# Altium footprint library General.PCBLIB: 130 footprints (part 4 of 9)
Each footprint in its own frame and in the unit in brackets; x right, y up, seen from the top. Pads: shape width x height; smd on the part's side, far side on the other; paste and mask are expansions set on the pad; w line width, h text height; cw(c..) or ccw(c..) is an arc to the next point about the centre after c.
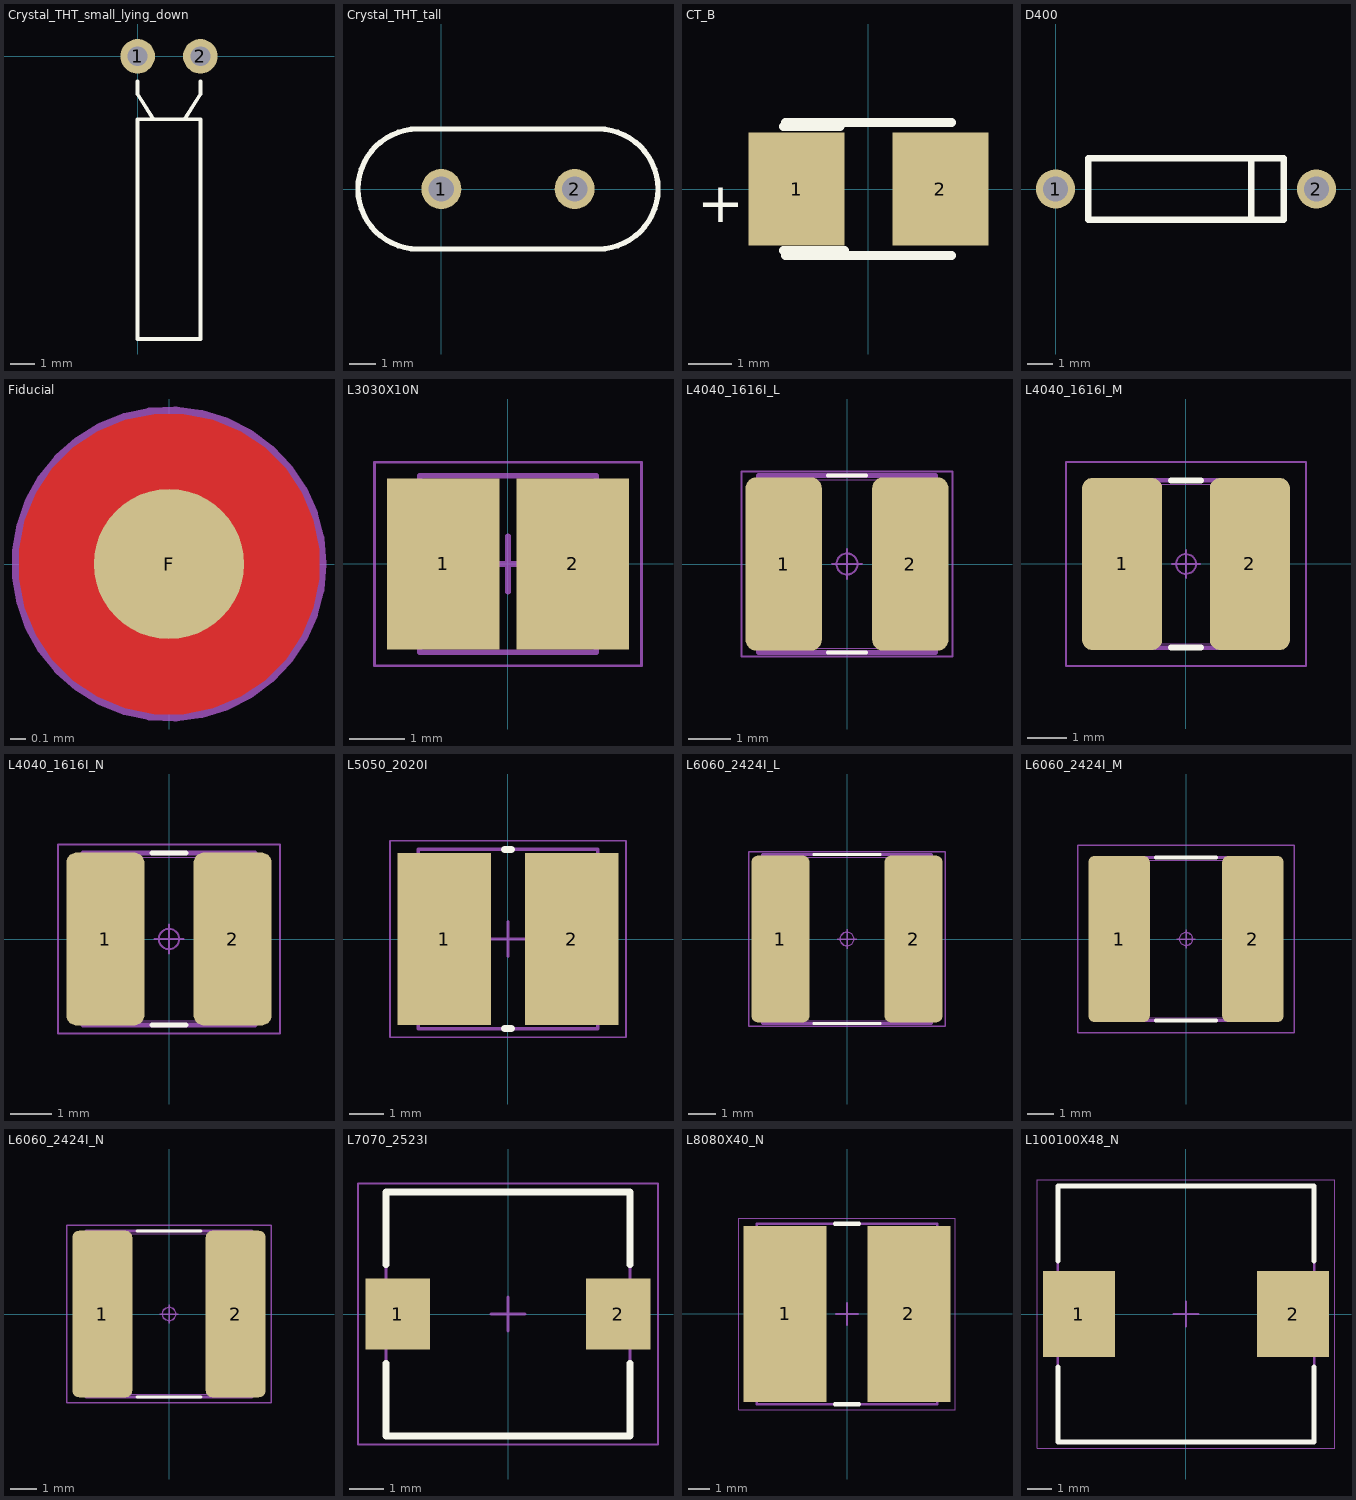
[diagram p3: the footprints below, top view; thin cyan lines are the x and y axes]

## Crystal_THT_small_lying_down [mm]
pads (2):
  round 1.4 hole 0.8: 1(0,0) 2(2.54,0)
Top Overlay:
  lines w0.15: 0,-1.016 0,-1.524 0.635,-2.54 ; 1.905,-2.54 2.54,-1.524 2.54,-1.016 ; 0,-11.43 0,-2.54 2.54,-2.54 2.54,-11.43 0,-11.43
Top DesignatorDoc:
  text ".Designator" at 1.27,-6.35 h1.2

## Crystal_THT_tall [mil] "Crystal tall THT"
height 551.18
pads (2):
  round 60 hole 38: 1(0,0) 2(200,0)
Top Overlay:
  lines w8: -35,-90 cw(c-35,0) -35,90 235,90 cw(c235,0) 235,-90 -35,-90
Top DesignatorDoc:
  text ".Designator" at 100,0 h47.24
3D body "User Library-Crystal_V2009.step": height 505.91, standoff -78.74, extent -112.6,-85 312.6,88.23

## CT_B [mm]
pads (2):
  rect 2.2x2.6 smd: 1(-1.651,0) 2(1.651,0)
Top Overlay:
  lines w0.203: -1.949,-1.414 -0.549,-1.414 ; -1.949,1.436 -0.649,1.436 ; -1.905,-1.524 1.905,-1.524 ; -1.905,1.524 1.905,1.524
  text "+" at -3.937,-0.762 h0.94
Top DesignatorDoc:
  text ".Designator" at 0,0 h1.2

## D400 [mil]
pads (2):
  round 60 hole 38: 1(0,0) 2(400,0)
Top Overlay:
  lines w10: 300,-47.24 300,47.24 ; 50,-47.24 350,-47.24 350,47.24 50,47.24 50,-47.24
Top DesignatorDoc:
  text ".Designator" at 200,0 h47.24

## Fiducial [mm]
pads (1):
  round 1 smd paste-2 mask+0.5: F(0,0)
Top Layer:
  region: 0,-1 -0.098,-1 -0.292,-0.962 -0.474,-0.886 -0.637,-0.777 -0.777,-0.637 -0.886,-0.474 -0.962,-0.292 -1,-0.098 -1,0 -1,0.098 -0.962,0.292 -0.886,0.474 -0.777,0.637 -0.637,0.777 -0.474,0.886 -0.292,0.962 -0.098,1 0,1 0.098,1 0.292,0.962 0.474,0.886 0.637,0.777 0.777,0.637 0.886,0.474 0.962,0.292 1,0.098 1,0 1,-0.098 0.962,-0.292 0.886,-0.474 0.777,-0.637 0.637,-0.777 0.474,-0.886 0.292,-0.962 0.098,-1
Top Body, 3D Models:
  circle w0.1: c0,0 r1
Top DesignatorDoc:
  text ".Designator" at 1.27,0 h1.2

## L3030X10N [mm] "Precision Wire Wound Inductor, 2-Leads, Body 3.00x3.00mm, IPC Medium Density"
height 1
pads (2):
  rect 2.05x3.1 smd: 1(-1.175,0) 2(1.175,0)
Top Body, 3D Models:
  lines w0.1: -1.6,-1.6 1.6,-1.6 1.6,1.6 -1.6,1.6 -1.6,-1.6
Top Courtyard:
  lines w0.05: -2.425,-1.85 2.425,-1.85 2.425,1.85 -2.425,1.85 -2.425,-1.85
  lines w0.1: -0.5,0 0.5,0 ; 0,-0.5 0,0.5
Top DesignatorDoc:
  text ".Designator" at 0,0 h1.2
3D body: height 1, standoff 0, extent -1.6,-1.6 1.6,1.6

## L4040_1616I_L [mm] "Inductor, Chip; 4.00 mm L X 4.00 mm W X 2.50 mm H body"
height 2.5
pads (2):
  rrect28% 1.81x4.12 smd: 1(-1.505,0) 2(1.505,0)
Top Overlay:
  lines w0.1: -0.45,-2.1 0.45,-2.1 ; -0.45,2.1 0.45,2.1
Top Dimensions:
  lines w0.12: -2.1,-2.1 -2.1,2.1 2.1,2.1 2.1,-2.1 -2.1,-2.1
Bottom Dimensions:
  lines w0.025: -2,-2 -0.75,-2 -0.75,2 -2,2 ; -2,-2 -2,2 ; -2,-2 -2,2 ; -2,-2 2,-2 ; -2,2 2,2 ; 2,-2 2,2 ; 2,-2 0.75,-2 0.75,2 2,2 ; 2,-2 2,2
Top Courtyard:
  circle w0.05: c0,0 r0.25
  lines w0.05: -0.35,0 0.35,0 ; 0,-0.35 0,0.35 ; -2.51,-2.2 -2.51,2.2 2.51,2.2 2.51,-2.2 -2.51,-2.2
Top DesignatorDoc:
  text ".Designator" at 0,0 h1
3D body "STEP-WE-LQS-4025-rev1.stp": height 2.15, standoff 0, extent -2,-2 2,2

## L4040_1616I_M [mm] "Inductor, Chip; 4.00 mm L X 4.00 mm W X 2.50 mm H body"
height 2.5
pads (2):
  rrect25% 2.01x4.32 smd: 1(-1.605,0) 2(1.605,0)
Top Overlay:
  lines w0.15: -0.375,-2.1 0.375,-2.1 ; -0.375,2.1 0.375,2.1
Top Dimensions:
  lines w0.12: -2.1,-2.1 2.1,-2.1 2.1,2.1 -2.1,2.1 -2.1,-2.1
Bottom Dimensions:
  lines w0.025: -2,-2 2,-2 ; -2,-2 -2,2 ; -2,-2 -2,2 ; -2,-2 -0.75,-2 -0.75,2 -2,2 ; -2,2 2,2 ; 2,-2 2,2 ; 2,-2 0.75,-2 0.75,2 2,2 ; 2,-2 2,2
Top Courtyard:
  circle w0.05: c0,0 r0.25
  lines w0.05: -0.35,0 0.35,0 ; 0,-0.35 0,0.35 ; -3.01,-2.56 3.01,-2.56 3.01,2.56 -3.01,2.56 -3.01,-2.56
Top DesignatorDoc:
  text ".Designator" at 0,0 h1.5
3D body "STEP-WE-LQS-4025-rev1.stp": height 2.15, standoff 0, extent -2,-2 2,2

## L4040_1616I_N [mm] "Inductor, Chip; 4.00 mm L X 4.00 mm W X 2.50 mm H body"
height 2.5
pads (2):
  rrect26% 1.91x4.22 smd: 1(-1.555,0) 2(1.555,0)
Top Overlay:
  lines w0.12: -0.42,-2.1 0.42,-2.1 ; -0.42,2.1 0.42,2.1
Top Dimensions:
  lines w0.12: -2.1,-2.1 -2.1,2.1 2.1,2.1 2.1,-2.1 -2.1,-2.1
Bottom Dimensions:
  lines w0.025: -2,-2 -0.75,-2 -0.75,2 -2,2 ; -2,-2 -2,2 ; -2,-2 -2,2 ; -2,-2 2,-2 ; -2,2 2,2 ; 2,-2 2,2 ; 2,-2 0.75,-2 0.75,2 2,2 ; 2,-2 2,2
Top Courtyard:
  circle w0.05: c0,0 r0.25
  lines w0.05: -0.35,0 0.35,0 ; 0,-0.35 0,0.35 ; -2.71,-2.31 -2.71,2.31 2.71,2.31 2.71,-2.31 -2.71,-2.31
Top DesignatorDoc:
  text ".Designator" at 0,0 h1.2
3D body "STEP-WE-LQS-4025-rev1.stp": height 2.15, standoff 0, extent -2,-2 2,2

## L5050_2020I [mm] "Precision Wire Wound Inductor, 2-Leads, Body 5,00x5,00mm, IPC Medium Density"
height 2.2
pads (2):
  rect 2.7x5 smd: 1(-1.85,0) 2(1.85,0)
Top Overlay:
  lines w0.2: -0.1,-2.6 0.1,-2.6 ; -0.1,2.6 0.1,2.6
Top Body, 3D Models:
  lines w0.1: -2.6,-2.6 2.6,-2.6 2.6,2.6 -2.6,2.6 -2.6,-2.6
Top Courtyard:
  lines w0.05: -3.425,-2.85 3.425,-2.85 3.425,2.85 -3.425,2.85 -3.425,-2.85
  lines w0.1: -0.5,0 0.5,0 ; 0,-0.5 0,0.5
Top DesignatorDoc:
  text ".Designator" at 0,0 h1.2
3D body: height 2.2, standoff 0, extent -2.6,-2.6 2.6,2.6

## L6060_2424I_L [mm] "Inductor, Chip; 6.00 mm L X 6.00 mm W X 2.80 mm H body"
height 2.8
pads (2):
  rrect23% 2.14x6.12 smd: 1(-2.44,0) 2(2.44,0)
Top Overlay:
  lines w0.1: -1.22,-3.1 1.22,-3.1 ; -1.22,3.1 1.22,3.1
Top Dimensions:
  lines w0.12: -3.1,-3.1 3.1,-3.1 3.1,3.1 -3.1,3.1 -3.1,-3.1
Bottom Dimensions:
  lines w0.025: -3,-3 3,-3 ; -3,-3 -3,3 ; -3,-3 -3,3 ; -3,-3 -1.5,-3 -1.5,3 -3,3 ; -3,3 3,3 ; 3,-3 3,3 ; 3,-3 1.5,-3 1.5,3 3,3 ; 3,-3 3,3
Top Courtyard:
  circle w0.05: c0,0 r0.25
  lines w0.05: -0.35,0 0.35,0 ; 0,-0.35 0,0.35 ; -3.61,-3.2 3.61,-3.2 3.61,3.2 -3.61,3.2 -3.61,-3.2
Top DesignatorDoc:
  text ".Designator" at 0,0 h1
3D body "STEP-WE-LQS-6045-rev1.stp": height 4.51, standoff 0.01, extent -3,-3 3,3

## L6060_2424I_M [mm] "Inductor, Chip; 6.00 mm L X 6.00 mm W X 2.80 mm H body"
height 2.8
pads (2):
  rrect21% 2.34x6.32 smd: 1(-2.54,0) 2(2.54,0)
Top Overlay:
  lines w0.15: -1.145,-3.1 1.145,-3.1 ; -1.145,3.1 1.145,3.1
Top Dimensions:
  lines w0.12: -3.1,-3.1 -3.1,3.1 3.1,3.1 3.1,-3.1 -3.1,-3.1
Bottom Dimensions:
  lines w0.025: -3,-3 -1.5,-3 -1.5,3 -3,3 ; -3,-3 -3,3 ; -3,-3 -3,3 ; -3,-3 3,-3 ; -3,3 3,3 ; 3,-3 3,3 ; 3,-3 1.5,-3 1.5,3 3,3 ; 3,-3 3,3
Top Courtyard:
  circle w0.05: c0,0 r0.25
  lines w0.05: -0.35,0 0.35,0 ; 0,-0.35 0,0.35 ; -4.11,-3.56 -4.11,3.56 4.11,3.56 4.11,-3.56 -4.11,-3.56
Top DesignatorDoc:
  text ".Designator" at 0,0 h1.5
3D body "STEP-WE-LQS-6045-rev1.stp": height 4.51, standoff 0.01, extent -3,-3 3,3

## L6060_2424I_N [mm] "Inductor, Chip; 6.00 mm L X 6.00 mm W X 2.80 mm H body"
height 2.8
pads (2):
  rrect22% 2.24x6.22 smd: 1(-2.49,0) 2(2.49,0)
Top Overlay:
  lines w0.12: -1.19,-3.1 1.19,-3.1 ; -1.19,3.1 1.19,3.1
Top Dimensions:
  lines w0.12: -3.1,-3.1 3.1,-3.1 3.1,3.1 -3.1,3.1 -3.1,-3.1
Bottom Dimensions:
  lines w0.025: -3,-3 3,-3 ; -3,-3 -3,3 ; -3,-3 -3,3 ; -3,-3 -1.5,-3 -1.5,3 -3,3 ; -3,3 3,3 ; 3,-3 3,3 ; 3,-3 1.5,-3 1.5,3 3,3 ; 3,-3 3,3
Top Courtyard:
  circle w0.05: c0,0 r0.25
  lines w0.05: -0.35,0 0.35,0 ; 0,-0.35 0,0.35 ; -3.81,-3.31 3.81,-3.31 3.81,3.31 -3.81,3.31 -3.81,-3.31
Top DesignatorDoc:
  text ".Designator" at 0,0 h1.2
3D body "STEP-WE-LQS-6045-rev1.stp": height 4.51, standoff 0.01, extent -3,-3 3,3

## L7070_2523I [mm]
height 4.8
pads (2):
  rect 1.9x2.1 smd: 1(-3.25,0) 2(3.25,0)
Top Overlay:
  lines w0.2: -3.6,-1.45 -3.6,-3.6 3.6,-3.6 3.6,-1.45 ; -3.6,1.45 -3.6,3.6 3.6,3.6 3.6,1.45
Top Body, 3D Models:
  lines w0.1: -3.6,-3.6 3.6,-3.6 3.6,3.6 -3.6,3.6 -3.6,-3.6
Top Courtyard:
  lines w0.05: -4.425,-3.85 4.425,-3.85 4.425,3.85 -4.425,3.85 -4.425,-3.85
  lines w0.1: -0.5,0 0.5,0 ; 0,-0.5 0,0.5
Top DesignatorDoc:
  text ".Designator" at 0,0 h1.2
3D body: height 4.8, standoff 0, extent -3.6,-3.6 3.6,3.6

## L8080X40_N [mm] "Precision Wire Wound Inductor, 2-Leads, Body 8.00x8.00x4.00mm, IPC Medium Density"
height 4
pads (2):
  rect 3.8x8.1 smd: 1(-2.85,0) 2(2.85,0)
Top Overlay:
  lines w0.2: -0.55,-4.15 0.55,-4.15 ; -0.55,4.15 0.55,4.15
Top Body, 3D Models:
  lines w0.1: -4.15,-4.15 4.15,-4.15 4.15,4.15 -4.15,4.15 -4.15,-4.15
Top Courtyard:
  lines w0.05: -4.975,-4.4 4.975,-4.4 4.975,4.4 -4.975,4.4 -4.975,-4.4
  lines w0.1: -0.5,0 0.5,0 ; 0,-0.5 0,0.5
Top DesignatorDoc:
  text ".Designator" at 0,0 h1.2
3D body "L_8080X40_N.step": height 4.1, standoff 0, extent -4.1,-4 4.1,4

## L100100X48_N [mm] "Precision Wire Wound Inductor, 2-Leads, Body 10.00x10.00mm, IPC Medium Density"
height 5.1
pads (2):
  rect 2.9x3.45 smd: 1(-4.3,0) 2(4.3,0)
Top Overlay:
  lines w0.2: -5.15,-2.125 -5.15,-5.15 5.15,-5.15 5.15,-2.125 ; -5.15,2.125 -5.15,5.15 5.15,5.15 5.15,2.125
Top Body, 3D Models:
  lines w0.1: -5.15,-5.15 5.15,-5.15 5.15,5.15 -5.15,5.15 -5.15,-5.15
Top Courtyard:
  lines w0.05: -5.975,-5.4 5.975,-5.4 5.975,5.4 -5.975,5.4 -5.975,-5.4
  lines w0.1: -0.5,0 0.5,0 ; 0,-0.5 0,0.5
Top DesignatorDoc:
  text ".Designator" at 0,0 h1.2
3D body "sru1048-330y.stp": height 4.81, standoff 0.01, extent -5,-5 5,5